# Altium integrated library BYTECH_HW_LIB_2019.IntLib: 907 symbols (part 5 of 6)
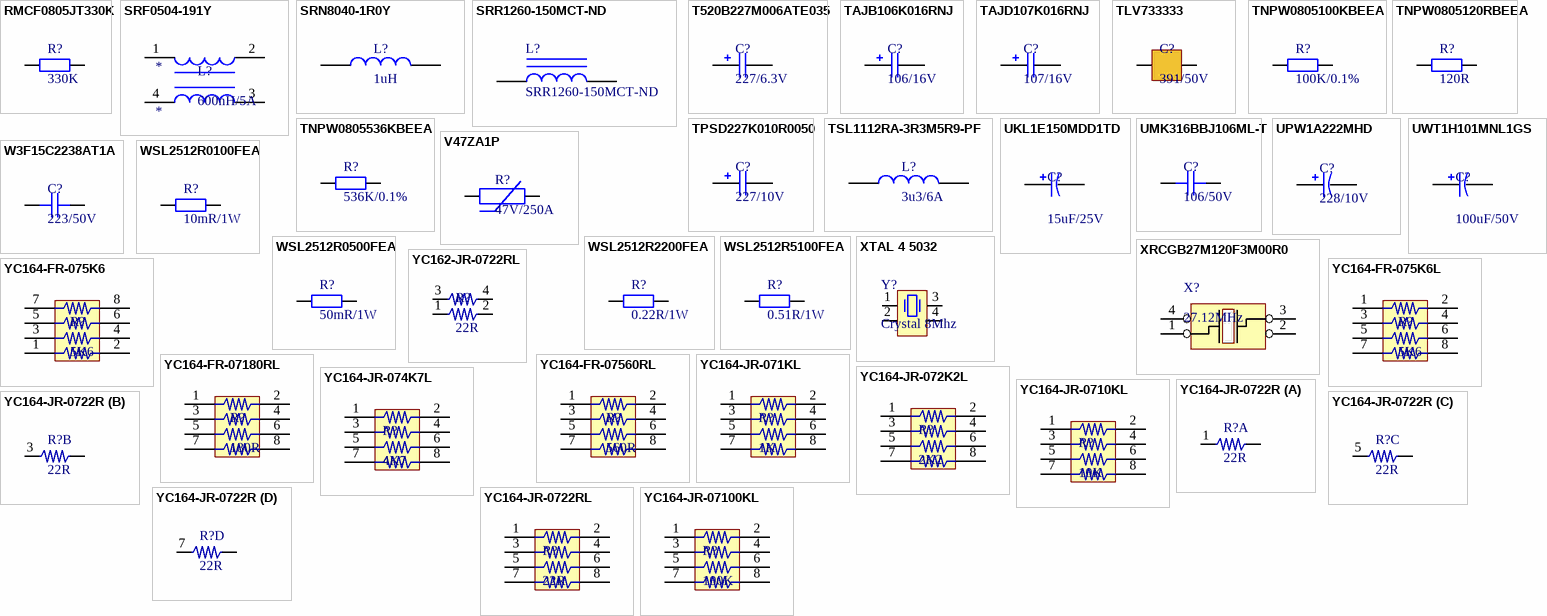
[diagram p43: symbols RMCF0805JT330K to YC164-JR-07100KL]

## UMK316BBJ106ML-T
designator C?, comment 106/50V
CAP CER 10uF 20% 50V X5R 1206; MPN: UMK316BBJ106ML-T; Solder: SMT; CompanyID: VT-01137; Value: 106/50V; Category: CAPACITOR; PinCount: 2
footprint CAPC-1206 (3216) (Resistor, Chip; 3.10 mm L X 1.60 mm W X 0.90 mm H body)
pins: 1, 2

## UPW1A222MHD
designator C?, comment 228/10V
CAP ALUM 2200uF 20% 10V RADIAL; MPN: UPW1A222MHD; CompanyID: VT-00942; Solder: WAVE; Value: 228/10V; Category: CAPACITOR; PinCount: 2
footprint CAP_ALUM_D125_S50_H200
pins: 1, 2

## UWT1H101MNL1GS
designator C?, comment 100uF/50V
CAP ALUM 100UF 20% 50V SMD; MPN: UWT1H101MNL1GS; Solder: SMT; Value: 100uF/50V; Category: CAPACITOR; PinCount: 2
footprint CAP_ALUM_SMT_NICHICON_H8xH10
pins: 1, 2
1 alternate drawing of the same symbol

## V47ZA1P
designator R?, comment 47V/250A
VARISTOR 47V 250A DISC 7MM; MPN: V47ZA1P; Solder: WAVE; CompanyID: VT-00888; Value: 47V/250A; Category: VARISTOR
footprint VARISTOR-V47ZA1P
pins: 1, 2

## W3F15C2238AT1A
designator C?, comment 223/50V
CAP FEEDTHRU 0.022uF 20% 50V 1206; MPN: W3F15C2238AT1A; CompanyID: VT-00531; Solder: SMT; Value: 223/50V; Category: CAPACITOR; PinCount: 2
footprint CAPC-1206 (3216) (Resistor, Chip; 3.10 mm L X 1.60 mm W X 0.90 mm H body)
pins: 1, 2

## WSL2512R0100FEA
designator R?, comment 10mR/1W
RES 0.01 OHM 1% 1W 2512; MPN: WSL2512R0100FEA; MFR: Vishay Dale; Solder: SMT; Value: 10mR/1W; Category: RESISTOR; PinCount: 2
footprint RESC-2512 (6432) (Chip Resistor, Body 6.3x3.2mm, IPC Medium Density)
pins: 1, 2

## WSL2512R0500FEA
designator R?, comment 50mR/1W
RES 0.05 OHM 1% 1W 2512; MPN: WSL2512R0500FEA; MFR: Vishay Dale; Solder: SMT; Value: 50mR/1W; Category: RESISTOR; PinCount: 2
footprint RESC-2512 (6432) (Chip Resistor, Body 6.3x3.2mm, IPC Medium Density)
pins: 1, 2

## WSL2512R2200FEA
designator R?, comment 0.22R/1W
RES 0.22 OHM 1% 1W 2512; MPN: WSL2512R2200FEA; MFR: Vishay Dale; Solder: SMT; Value: 0.22R/1W; Category: RESISTOR; PinCount: 2
footprint RESC-2512 (6432) (Chip Resistor, Body 6.3x3.2mm, IPC Medium Density)
pins: 1, 2

## WSL2512R5100FEA
designator R?, comment 0.51R/1W
RES 0.51 OHM 1% 1W 2512; MPN: WSL2512R5100FEA; MFR: Vishay Dale; Solder: SMT; Value: 0.51R/1W; Category: RESISTOR; PinCount: 2
footprint RESC-2512 (6432) (Chip Resistor, Body 6.3x3.2mm, IPC Medium Density)
pins: 1, 2

## XRCGB27M120F3M00R0
designator X?, comment 27.12MHz
CRYSTAL 27.1200MHZ 6pF SMD; MPN: XRCGB27M120F3M00R0; CompanyID: VT-00760; Solder: SMT; Value: 27.12MHz; Category: CRYSTAL
footprint CRYSTAL-XRCGB27M120F3M10R0 (2x1.6)
pins: 1, 2, 3, 4

## XTAL 4 5032
designator Y?, comment Crystal 8Mhz
CRYSTAL 8.0000MHZ 20PF SMD; MFR: Taisaw; MPN: TZ3063D
footprint Crystal 5032 - 4P (Surface Mount, crystal 4lead, 5.0mm x 3.20mm)
pins: 1 OSC1, 2 GND (power), 3 OSC2, 4 GND (power)

## YC162-JR-0722RL
designator R?, comment 22R
RES ARRAY 2 RES 22 OHM 0606; MPN: YC162-JR-0722RL; CompanyID: VT-01381; Solder: SMT; Value: 22R; Category: RESISTOR; PinCount: 4
footprint CAC-80P160X160-4N (Chip Array, Concave, 4-Leads, Pitch 0.80mm,  Body 1.60x1.60mm,  IPC Medium Density)
pins: 1, 2, 3, 4

## YC164-FR-075K6
designator R?, comment 5K6
RES ARRAY 5K6 (4x0603); MPN: YC164-FR-075K6; CompanyID: VT-00873; Solder: SMT; Value: 5K6; Category: RESISTOR; PinCount: 8
footprint RESC_ARRAY_4x0603 (Resistor, Chip Array, 2 Side Convex, 0.80 mm pitch; 8 pin, 3.20 mm L X 1.60 mm W X 0.60 mm H body)
pins: 1, 2, 3, 4, 5, 6, 7, 8

## YC164-FR-075K6L
designator R?, comment 5K6
RES ARRAY 4 RES 5K6 OHM 1206 (4x0603); MPN: YC164-FR-075K6L; CompanyID: VT-00873; Solder: SMT; Value: 5K6; Category: RESISTOR; PinCount: 8
footprint RESC_ARRAY_4x0603 (Resistor, Chip Array, 2 Side Convex, 0.80 mm pitch; 8 pin, 3.20 mm L X 1.60 mm W X 0.60 mm H body)
pins: 1, 2, 3, 4, 5, 6, 7, 8

## YC164-FR-07180RL
designator R?, comment 180R
RES ARRAY 4 RES 180R OHM 1206 (4x0603); MPN: YC164-FR-07180RL; Solder: SMT; Value: 180R; Category: RESISTOR; PinCount: 8
footprint RESC_ARRAY_4x0603 (Resistor, Chip Array, 2 Side Convex, 0.80 mm pitch; 8 pin, 3.20 mm L X 1.60 mm W X 0.60 mm H body)
pins: 1, 2, 3, 4, 5, 6, 7, 8

## YC164-FR-07560RL
designator R?, comment 560R
RES ARRAY 4 RES 560R OHM 1206 (4x0603); MPN: YC164-FR-07560RL; Solder: SMT; Value: 560R; Category: RESISTOR; PinCount: 8
footprint RESC_ARRAY_4x0603 (Resistor, Chip Array, 2 Side Convex, 0.80 mm pitch; 8 pin, 3.20 mm L X 1.60 mm W X 0.60 mm H body)
pins: 1, 2, 3, 4, 5, 6, 7, 8

## YC164-JR-071KL
designator R?, comment 1K
RES ARRAY 4 RES 1K OHM 1206 (4x0603); MPN: YC164-JR-071KL; Solder: SMT; CompanyID: VT-00784; Value: 1K; Category: RESISTOR; PinCount: 8
footprint RESC_ARRAY_4x0603 (Resistor, Chip Array, 2 Side Convex, 0.80 mm pitch; 8 pin, 3.20 mm L X 1.60 mm W X 0.60 mm H body)
pins: 1, 2, 3, 4, 5, 6, 7, 8

## YC164-JR-072K2L
designator R?, comment 2K2
RES ARRAY 4 RES 2.2K OHM 1206 (4x0603); MPN: YC164-JR-072K2L; CompanyID: VT-00872; Solder: SMT; Value: 2K2; Category: RESISTOR; PinCount: 8
footprint RESC_ARRAY_4x0603 (Resistor, Chip Array, 2 Side Convex, 0.80 mm pitch; 8 pin, 3.20 mm L X 1.60 mm W X 0.60 mm H body)
pins: 1, 2, 3, 4, 5, 6, 7, 8

## YC164-JR-074K7L
designator R?, comment 4K7
RES ARRAY 4 RES 4.7K OHM 1206 (4x0603); MPN: YC164-JR-074K7L; Solder: SMT; CompanyID: VT-0979; Value: 4K7; Category: RESISTOR; PinCount: 8
footprint RESC_ARRAY_4x0603 (Resistor, Chip Array, 2 Side Convex, 0.80 mm pitch; 8 pin, 3.20 mm L X 1.60 mm W X 0.60 mm H body)
pins: 1, 2, 3, 4, 5, 6, 7, 8

## YC164-JR-0710KL
designator R?, comment 10K
RES ARRAY 4 RES 10K OHM 1206 (4x0603); MPN: YC164-JR-0710KL; CompanyID: VT-00783; Solder: SMT; Value: 10K; Category: RESISTOR; PinCount: 8
footprint RESC_ARRAY_4x0603 (Resistor, Chip Array, 2 Side Convex, 0.80 mm pitch; 8 pin, 3.20 mm L X 1.60 mm W X 0.60 mm H body)
pins: 1, 2, 3, 4, 5, 6, 7, 8

## YC164-JR-0722R
designator R?, comment 22R
RES ARRAY 4 RES 22 OHM 1206 (4x0603); MPN: YC164-JR-0722RL; Solder: SMT; CompanyID: VT-00902; Value: 22R; Category: RESISTOR; PinCount: 8
footprint RESC_ARRAY_4x0603 (Resistor, Chip Array, 2 Side Convex, 0.80 mm pitch; 8 pin, 3.20 mm L X 1.60 mm W X 0.60 mm H body)
part A pins: 1, 2
part B pins: 3, 4
part C pins: 5, 6
part D pins: 7, 8

## YC164-JR-0722RL
designator R?, comment 22R
RES ARRAY 4 RES 22 OHM 1206 (4x0603); MPN: YC164-JR-0722RL; CompanyID: VT-00902; Solder: SMT; Value: 22R; Category: RESISTOR; PinCount: 8
footprint RESC_ARRAY_4x0603 (Resistor, Chip Array, 2 Side Convex, 0.80 mm pitch; 8 pin, 3.20 mm L X 1.60 mm W X 0.60 mm H body)
pins: 1, 2, 3, 4, 5, 6, 7, 8

## YC164-JR-07100KL
designator R?, comment 100K
RES ARRAY 4 RES 100K OHM 1206 (4x0603); MPN: YC164-JR-07100KL; Solder: SMT; CompanyID: VT-01239; Value: 100K; Category: RESISTOR; PinCount: 8
footprint RESC_ARRAY_4x0603 (Resistor, Chip Array, 2 Side Convex, 0.80 mm pitch; 8 pin, 3.20 mm L X 1.60 mm W X 0.60 mm H body)
pins: 1, 2, 3, 4, 5, 6, 7, 8

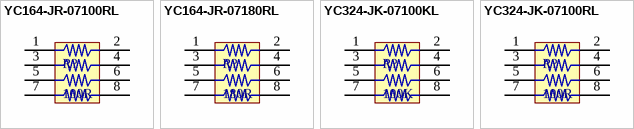
[diagram p27: symbols YC164-JR-07100RL to YC324-JK-07100RL]

## YC164-JR-07100RL
designator R?, comment 100R
RES ARRAY 4 RES 100 OHM 1206 (4x0603); MPN: YC164-JR-07100RL; Solder: SMT; Value: 100R; Category: RESISTOR; PinCount: 8
footprint RESC_ARRAY_4x0603 (Resistor, Chip Array, 2 Side Convex, 0.80 mm pitch; 8 pin, 3.20 mm L X 1.60 mm W X 0.60 mm H body)
pins: 1, 2, 3, 4, 5, 6, 7, 8

## YC164-JR-07180RL
designator R?, comment 180R
RES ARRAY 4 RES 180 OHM 1206 (4x0603); MPN: YC164-JR-07180RL; CompanyID: VT-01022; Solder: SMT; Value: 180R; Category: RESISTOR; PinCount: 8
footprint RESC_ARRAY_4x0603 (Resistor, Chip Array, 2 Side Convex, 0.80 mm pitch; 8 pin, 3.20 mm L X 1.60 mm W X 0.60 mm H body)
pins: 1, 2, 3, 4, 5, 6, 7, 8

## YC324-JK-07100KL
designator R?, comment 100K
RES ARRAY 4 RES 100K OHM 2012 (4x0805); MPN: YC324-JK-07100KL; Solder: SMT; CompanyID: VT-01236; Value: 100K; Category: RESISTOR; PinCount: 8
footprint RESC_ARRAY_4x0805 (Resistor, Chip Array, 2 Side Convex, 1.27 mm pitch; 8 pin, 5.08 mm L X 3.20 mm W X 0.60 mm H body)
pins: 1, 2, 3, 4, 5, 6, 7, 8

## YC324-JK-07100RL
designator R?, comment 100R
RES ARRAY 4 RES 100 OHM 2012 (4x0805); MPN: YC324-JK-07100RL; CompanyID: VT-01111; Solder: SMT; Value: 100R; Category: RESISTOR; PinCount: 8
footprint RESC_ARRAY_4x0805 (Resistor, Chip Array, 2 Side Convex, 1.27 mm pitch; 8 pin, 5.08 mm L X 3.20 mm W X 0.60 mm H body)
pins: 1, 2, 3, 4, 5, 6, 7, 8


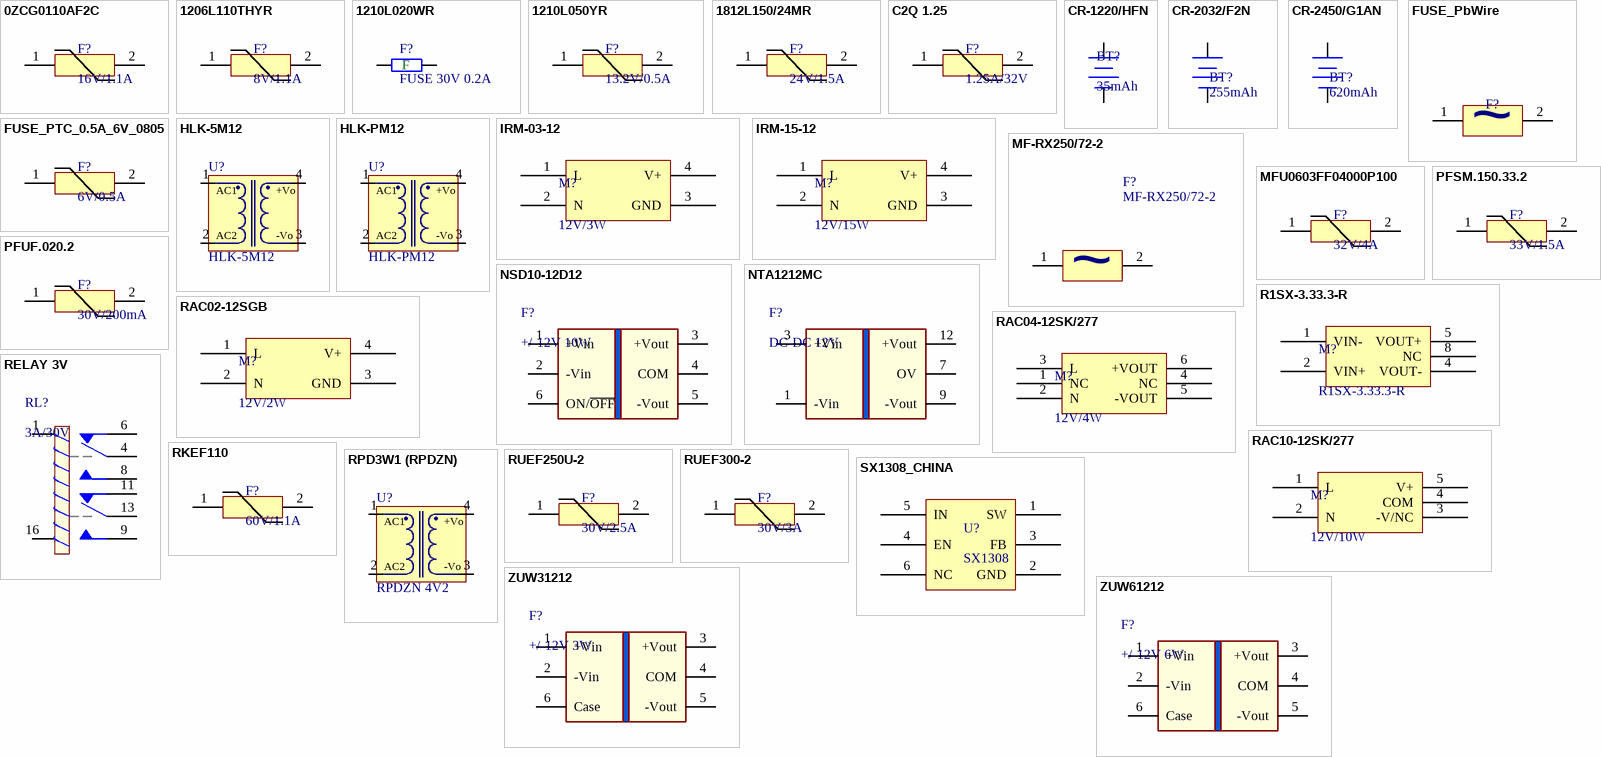
[diagram p28: symbols 0ZCG0110AF2C to ZUW61212]

## 0ZCG0110AF2C
designator F?, comment 16V/1.1A
FUSE-PTC RESTTBLE 1.10A 16V CHIP 1812; MPN: 0ZCG0110AF2C; Solder: SMT; CompanyID: VT-00835; Value: 16V/1.1A
footprint FUSE_1812(4532)
pins: 1, 2

## 1206L110THYR
designator F?, comment 8V/1.1A
FUSE PTC RESET 8V 1.10A 1206; MPN: 1206L110THYR; CompanyID: VT-01102; Solder: SMT; Value: 8V/1.1A
footprint FUSE_1206(3216)
pins: 1, 2

## 1210L020WR
designator F?, comment FUSE 30V 0.2A
PTC RESET 30V 0.2A SMD 1210; MPN: PFUF.020.2; MF-USMF020-2; 1210L020WR; CompanyID: VT-00588; Solder: SMT; Value: FUSE 30V 0.2A
footprint 1210_FUSE
pins: 1, 2
text: F

## 1210L050YR
designator F?, comment 13.2V/0.5A
FUSE PTC RESETTABLE 13.2V 0.5A 1210; MPN: 1210L050YR; Solder: SMT; CompanyID: VT-01118; Value: 13.2V/0.5A
footprint FUSE- 1210 (3225)
pins: 1, 2

## 1812L150/24MR
designator F?, comment 24V/1.5A
FUSE PTC RESETTABLE 24V 1.50A 1812L; MPN: 1812L150/24MR; Solder: SMT; CompanyID: VT-00870; Value: 24V/1.5A
footprint FUSE_1812(4532)
pins: 1, 2

## C2Q 1.25
designator F?, comment 1.25A/32V
FUSE BOARD MNT 1.25A 32VAC 63VDC 0603; MPN: C2Q 1.25; Solder: SMT; CompanyID: VT-01139; Value: 1.25A/32V
footprint FUSE_0603(1608) (Chip Inductor, Body 0.6x0.3mm, IPC High Density)
pins: 1, 2

## CR-1220/HFN
designator BT?, comment 35mAh
BATTERY LITHIUM 3V 35mAh COIN 12.5MM; MPN: CR-1220/HFN; Solder: HAND; CompanyID: VT-01136; Value: 35mAh
footprint BATERRY_CR1220
pins: 1 +, 2 -

## CR-2032/F2N
designator BT?, comment 255mAh
BATTERY LITHIUM 3V 225mAh COIN 20MM; MPN: CR-2032/F2N; Solder: HAND; CompanyID: VT-01026; Value: 255mAh
footprint BATTERY_CR2032 SMD
pins: 1 +, 2 -

## CR-2450/G1AN
designator BT?, comment 620mAh
BATTERY LITHIUM 3V 620mAhCOIN 24.5MM; MPN: CR-2450/G1AN; Solder: HAND; CompanyID: VT-00216; Value: 620mAh
footprint BATERRY_CR2450-3P
pins: 1 +, 2 -

## FUSE_PbWire
designator F?
PB wire fuse; Solder: SMT; CompanyID: VT-xxxx
footprint FUSE_3A_HOLDER
pins: 1, 2
text: ~

## FUSE_PTC_0.5A_6V_0805
designator F?, comment 6V/0.5A
FUSE PTC 0.5A 6V SMD 0805; MPN: FUSE_PTC_0.5A_6V_0805; Solder: SMT; Value: 6V/0.5A
footprint FUSE_0805(2012) (Footprint not found)
pins: 1, 2

## HLK-5M12
designator U?
Ultra-compact module power 12V/5W; MFR: Hi-link; Solder: WAVE; Category: MODULE; MPN: HLK-5M12; PinCount: 4; Value: 12V/5W
footprint HLK-5M12 (Power AC-DC, Body 38x23mm, IPC High Density)
pins: 1 AC, 2, 3, 4
text: AC1; +Vo; AC2; -Vo

## HLK-PM12
designator U?
Ultra-compact module power; MFR: Hi-link; Solder: WAVE; Value: 12V/3W; Category: MODULE; MPN: HLK-PM12; PinCount: 4
footprint HLK-PM12 (Power AC-DC, Body 34x20.2mm, IPC High Density)
pins: 1 AC, 2, 3, 4
text: AC1; +Vo; AC2; -Vo

## IRM-03-12
designator M?, comment 12V/3W
AC/DC CONVERTER 12V 3W; MPN: IRM-03-12; MFR: MEAN WELL; Solder: WAVE; Value: 12V/3W; Category: MODULE; PinCount: 4
footprint IRM-03-12 (Footprint not found)
pins: 1 L, 2 N, 3 GND, 4 V+
1 alternate drawing of the same symbol

## IRM-15-12
designator M?, comment 12V/15W
AC/DC CONVERTER 12V 15W; MPN: IRM-15-12; MFR: MEAN WELL; Solder: WAVE; Value: 12V/15W; Category: MODULE; PinCount: 4
footprint IRM-15-12 (Footprint not found)
pins: 1 L, 2 N, 3 GND, 4 V+
1 alternate drawing of the same symbol

## MF-RX250/72-2
designator F?
FUSE PTC RESETTABLE  2.5A  72V; Solder: SMT; CompanyID: VT-xxxx; MPN: MF-RX250/72-2; Value: MF-RX250/72-2
pins: 1, 2
text: ~

## MFU0603FF04000P100
designator F?, comment 32V/4A
FUSE BOARD MOUNT 4A 32VDC 0603; MPN: MFU0603FF04000P100; Solder: SMT; CompanyID: VT-00111; Value: 32V/4A
footprint FUSE_0603(1608) (Chip Inductor, Body 0.6x0.3mm, IPC High Density)
pins: 1, 2

## NSD10-12D12
designator F?, comment +/-12V 10W
DC DC CONVERTER +/-12V 10W; MPN: NSD10-12D12; Solder: WAVE; Value: +/-12V 10W
footprint MW-NSD10
pins: 1 +Vin, 2 -Vin, 3 +Vout, 4 COM, 5 -Vout, 6 ON/~{OFF}

## NTA1212MC
designator F?, comment DC-DC 12V
DC DC CONVERTER +/-12V 1W; MPN: NTA1212MC; Solder: SMT; Value: DC-DC 12V
footprint NTA1212MC
pins: 1 -Vin, 3 +Vin, 7 OV, 9 -Vout, 12 +Vout

## PFSM.150.33.2
designator F?, comment 33V/1.5A
FUSE PTC 1.5A 33V FST-TRIP SMD; MPN: PFSM.150.33.2; Solder: SMT; CompanyID: VT-01027; Value: 33V/1.5A
footprint FUSE_PFSM.150.33.2
pins: 1, 2

## PFUF.020.2
designator F?, comment 30V/200mA
FUSE PTC 200mA 30V RESET SMD; MPN: PFUF.020.2; CompanyID: VT-00588; Solder: SMT; Value: 30V/200mA
footprint FUSE- 1210 (3225)
pins: 1, 2

## R1SX-3.33.3-R
designator M?
DC DC CONVERTER 3.3V 1W; MFR: Recom Power; Solder: WAVE; MPN: R1SX-3.33.3-R; Value: R1SX-3.33.3-R; Category: MODULE; PinCount: 4
footprint R1SX-XXX (Footprint not found)
pins: 1 VIN-, 2 VIN+, 4 VOUT-, 5 VOUT+, 8 NC
1 alternate drawing of the same symbol

## RAC02-12SGB
designator M?, comment 12V/2W
AC/DC CONVERTER 12V 2W; MPN: RAC02-12SGB; Solder: WAVE; Value: 12V/2W; Category: MODULE; PinCount: 4
footprint RAC02-12SGB (Footprint not found)
pins: 1 L, 2 N, 3 GND, 4 V+
1 alternate drawing of the same symbol

## RAC04-12SK/277
designator M?, comment 12V/4W
AC/DC CONVERTER 12V 4W; MPN: RAC04-12SK/277; Solder: WAVE; Value: 12V/4W; Category: MODULE; PinCount: 6
footprint RAC04-12SK/277 (Footprint not found)
pins: 1 NC, 2 N, 3 L, 4 NC, 5 -VOUT, 6 +VOUT
1 alternate drawing of the same symbol

## RAC10-12SK/277
designator M?, comment 12V/10W
AC/DC CONVERTER 12V 10W; MPN: RAC10-12SK/277; Solder: WAVE; Value: 12V/10W; Category: MODULE; PinCount: 5
footprint RAC10-12SK/277
pins: 1 L, 2 N, 3 -V/NC, 4 COM, 5 V+
1 alternate drawing of the same symbol

## RELAY 3V
designator RL?, comment 3A/30V
RELAY dual switch, coil 3V; MPN: HFD2-003-M-L1; Solder: WAVE; Value: 3A/30V
footprint RELAY 3V
pins: 1 V+, 4 COm1, 6 NC1, 8 NO1, 9 NO2, 11 NC2, 13 COM2, 16 V-

## RKEF110
designator F?, comment 60V/1.1A
PTC RESET FUSE 60V 1.1A RADIAL; MPN: RKEF110; MFR: Littelfuse Inc.; Solder: WAVE; Value: 60V/1.1A
footprint FUSE-RUEF300 (PTC Resettable Fuses - 3A)
pins: 1, 2

## RPD3W1 (RPDZN)
designator U?, comment RPDZN 4V2
Ultra-compact module power; MFR: No Brand; Solder: WAVE; Value: 4V2/700mA; Category: MODULE; MFR_URL: https://item.taobao.com/item.htm?spm=a230r.1.14.1.3e96105f3ARyPk&id=527538079756&ns=1&abbucket=16#detail; MPN: RPDZN 4V2; PinCount: 4
footprint RPD3W1 (RPDZN)
pins: 1 AC, 2, 3, 4
text: AC1; +Vo; AC2; -Vo

## RUEF250U-2
designator F?, comment 30V/2.5A
FUSE POLYSWITCH RUE SERIES 2.5A 30V; MPN: RUEF250U-2; CompanyID: VT-00891; Solder: WAVE; Value: 30V/2.5A
footprint FUSE-RUEF250U-2 (PTC Resettable Fuses - 2A)
pins: 1, 2

## RUEF300-2
designator F?, comment 30V/3A
PTC RESET FUSE 30V 3A RADIAL; MPN: RUEF300-2; MFR: Littelfuse Inc.; Solder: WAVE; CompanyID: VT-00887; Value: 30V/3A
footprint FUSE-RUEF300 (PTC Resettable Fuses - 3A)
pins: 1, 2

## SX1308_CHINA
designator U?, comment SX1308
footprint SOT23-6
pins: 1 SW (power), 2 GND (power), 3 FB (power), 4 EN (power), 5 IN (power), 6 NC (power)

## ZUW31212
designator F?, comment +/-12V 3W
DC DC CONVERTER +/-12V 3W; MPN: ZUW31212; Solder: WAVE; Value: +/-12V 3W
footprint COSEL_ZUW31212
pins: 1 +Vin, 2 -Vin, 3 +Vout, 4 COM, 5 -Vout, 6 Case

## ZUW61212
designator F?, comment +/-12V 6W
DC DC CONVERTER +/-12V 6W; MPN: ZUW61212; Solder: WAVE; Value: +/-12V 6W
footprint COSEL_ZUW61212
pins: 1 +Vin, 2 -Vin, 3 +Vout, 4 COM, 5 -Vout, 6 Case


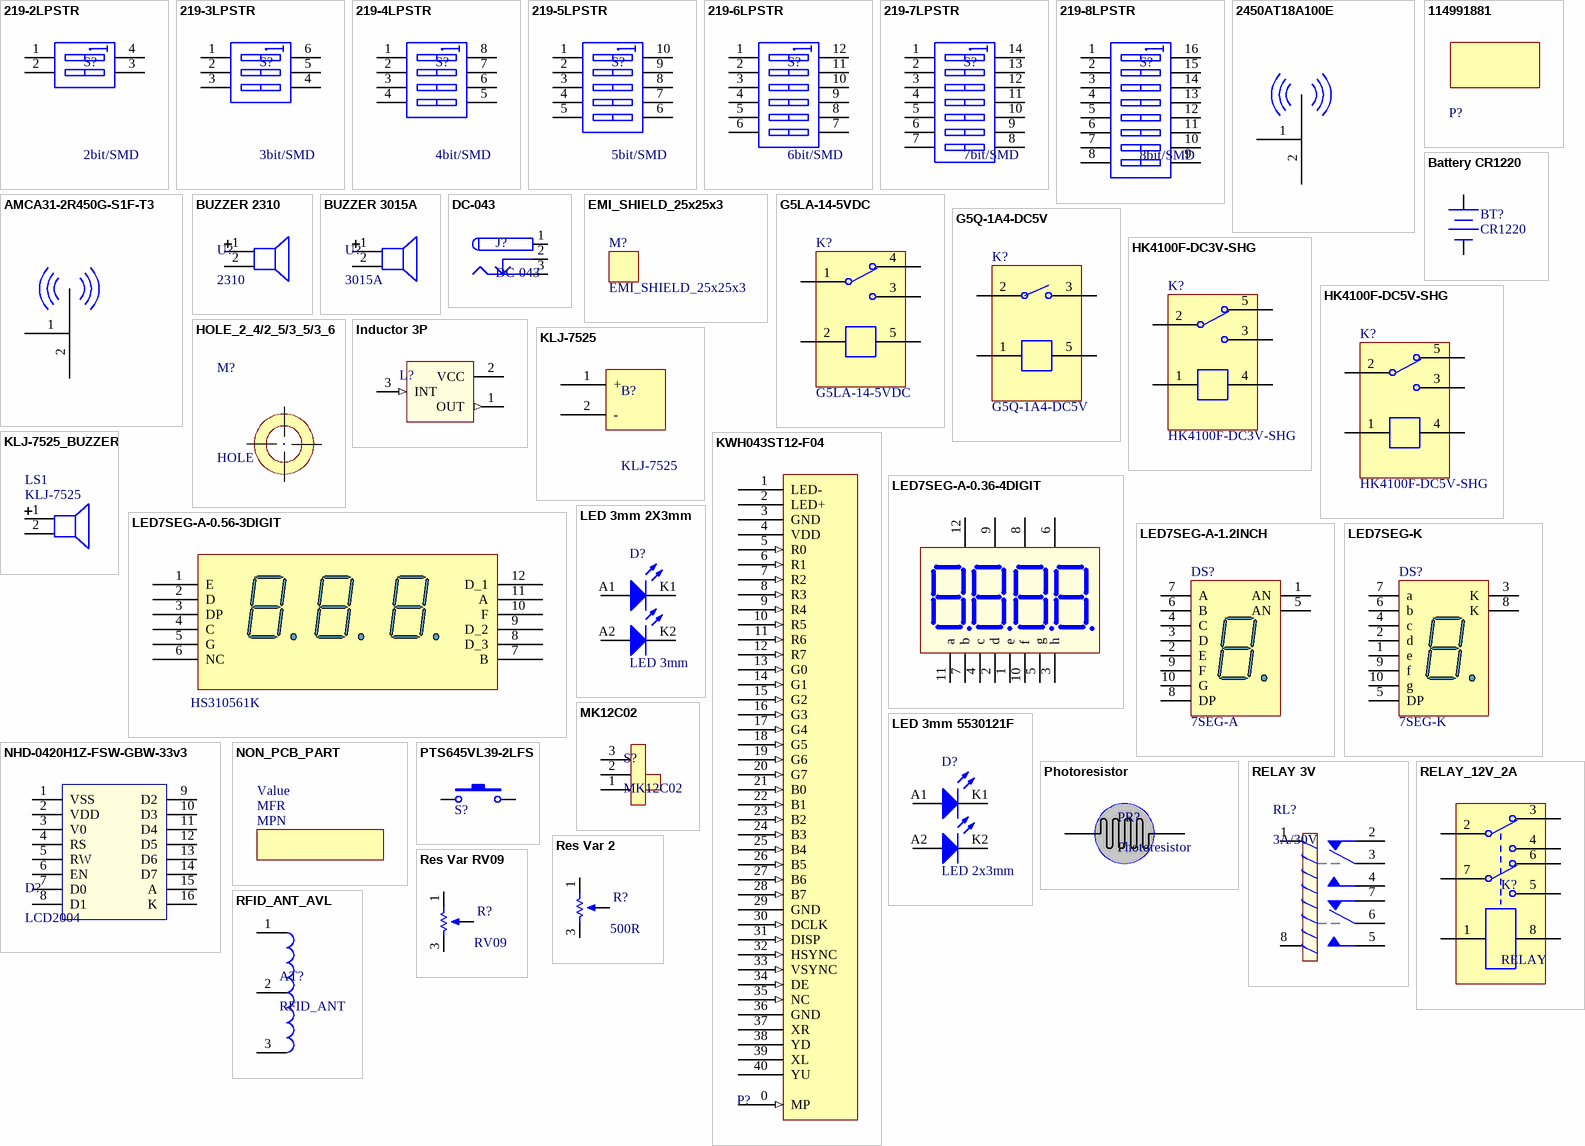
[diagram p29: symbols 219-2LPSTR to RFID_ANT_AVL]

## 219-2LPSTR
designator S?, comment 2bit/SMD
SWITCH SLIDE DIP SPST 100MA 20V; MPN: 219-2LPSTR; CompanyID: VT-xxxx; Solder: SMT; Value: 2bit/SMD
footprint 219-2LPSTR (Footprint not found)
pins: 1 A1, 2 A2, 3 B2, 4 B1

## 219-3LPSTR
designator S?, comment 3bit/SMD
SWITCH SLIDE DIP SPST 100MA 20V; MPN: 219-3LPSTR; CompanyID: VT-xxxx; Solder: SMT; Value: 3bit/SMD
footprint 219-3LPSTR (Footprint not found)
pins: 1 A1, 2 A2, 3 A3, 4 A4, 5 B4, 6 B3

## 219-4LPSTR
designator S?, comment 4bit/SMD
SWITCH SLIDE DIP SPST 100MA 20V; MPN: 219-4LPSTR; CompanyID: VT-xxxx; Solder: SMT; Value: 4bit/SMD
footprint 219-4LPSTR (Footprint not found)
pins: 1 A1, 2 A2, 3 A3, 4 A4, 5 B4, 6 B3, 7 B2, 8 B1

## 219-5LPSTR
designator S?, comment 5bit/SMD
SWITCH SLIDE DIP SPST 100MA 20V; MPN: 219-5LPSTR; CompanyID: VT-xxxx; Solder: SMT; Value: 5bit/SMD
footprint 219-5LPSTR (Footprint not found)
pins: 1 A1, 2 A2, 3 A3, 4 A4, 5 B4, 6 B3, 7 B2, 8 B1, 9 B2, 10 B3

## 219-6LPSTR
designator S?, comment 6bit/SMD
SWITCH SLIDE DIP SPST 100MA 20V; MPN: 219-6LPSTR; CompanyID: VT-xxxx; Solder: SMT; Value: 6bit/SMD
footprint 219-6LPSTR (Footprint not found)
pins: 1 A1, 2 A2, 3 A3, 4 A4, 5 A5, 6 A6, 7 B2, 8 B1, 9 B2, 10 B3, 11 B4, 12 B5

## 219-7LPSTR
designator S?, comment 7bit/SMD
SWITCH SLIDE DIP SPST 100MA 20V; MPN: 219-7LPSTR; CompanyID: VT-xxxx; Solder: SMT; Value: 7bit/SMD
footprint 219-7LPSTR (SWITCH SLIDE DIP SPST 100MA 20V)
pins: 1 A1, 2 A2, 3 A3, 4 A4, 5 A5, 6 A6, 7 B2, 8 B1, 9 B2, 10 B3, 11 B4, 12 B5, 13 B6, 14 B7

## 219-8LPSTR
designator S?, comment 8bit/SMD
SWITCH SLIDE DIP SPST 100MA 20V; MPN: 219-8LPSTR; CompanyID: VT-xxxx; Solder: SMT; Value: 8bit/SMD
footprint 219-8LPSTR (SWITCH SLIDE DIP SPST 100MA 20V)
pins: 1 A1, 2 A2, 3 A3, 4 A4, 5 A5, 6 A6, 7 B2, 8 B3, 9 B2, 10 B3, 11 B4, 12 B5, 13 B6, 14 B7, 15 B8, 16 B9

## 2450AT18A100E
designator AT?, comment 2.4GHz  (value not drawn)
RF ANT 2.4GHZ CHIP SOLDER SMD; MPN: 2450AT18A100E; MFR: Johanson Technology Inc.; Solder: SMT; Value: 2.4GHz
footprint 2450AT18A100E (Footprint not found)
pins: 1 AT, 2 0

## 114991881
designator P?  (value not drawn)
OV2640 FISHEYE CAMERA; MFR: Seeed Technology Co., Ltd; Value: 114991881; MPN: 114991881; MFR_URL: *
footprint SEEED_OV2640_CAM (Footprint not found)

## AMCA31-2R450G-S1F-T3
designator AT?, comment 2.4GHz  (value not drawn)
RF ANT 2.4GHZ CHIP SOLDER SMD; MPN: AMCA31-2R450G-S1F-T3; Solder: SMT; Value: 2.4GHz
footprint AMCA31-2R450G-S1F-T3 (Footprint not found)
pins: 1 AT, 2 0

## Battery CR1220
designator BT?, comment CR1220
Multicell Battery
footprint PIN3V-CR1220
pins: 1 +, 2 -

## BUZZER 2310
designator U?, comment 2310
Loa gốm 23mm - pitch 10mm
footprint BUZZ_23mm
pins: 1, 2

## BUZZER 3015A
designator U?, comment 3015A
footprint BUZZER 3015A
pins: 1, 2

## DC-043
designator J?
DC Plug 4.5mm/1.65mm
footprint DC43 (DC plug 4.5mm/1.65mm)
pins: 1 (power), 2 (power), 3 (power)

## EMI_SHIELD_25x25x3
designator M?
Sold By: SMT; MPN: EMI_SHIELD_25x25x3; Value: EMI_SHIELD_25x25x3
footprint EMI_SHIELD_25x25x3 (Footprint not found)

## G5LA-14-5VDC
designator K?
5V, 5pin, 10A; Solder: HAND; MPN: G5LA-14-5VDC; CompanyID: *; Value: G5LA-14-5VDC
footprint G5LA-14 (Footprint not found)
pins: 1, 2, 3, 4, 5

## G5Q-1A4-DC5V
designator K?
5V, 5pin, 10A; MPN: G5LA-14-5VDC; Solder: HAND; Value: G5LA-14-5VDC; CompanyID: *
footprint G5Q-1A4-DC5
pins: 1 2, 2, 3, 5

## HK4100F-DC3V-SHG
designator K?
3V, 6pin, 3A; Solder: HAND; MPN: HK4100F-DC3V-SHG; CompanyID: *; Value: HK4100F-DC3V
footprint HK4100F (Footprint not found)
pins: 1, 2, 3, 4, 5

## HK4100F-DC5V-SHG
designator K?
5V, 6pin, 3A; Solder: HAND; MPN: HK4100F-DC5V-SHG; CompanyID: *; Value: HK4100F-DC5V
footprint HK4100F (Footprint not found)
pins: 1, 2, 3, 4, 5

## HOLE_2_4/2_5/3_5/3_6
designator M?, comment HOLE  (no BOM)
HOLE 2_4/2_5/3_5/3_6; MPN: None; Solder: Not Fill; CompanyID: VT-; ClassName: MECH_HOLE; Value: HOLE
footprint HOLE_3MM_5MM
footprint HOLE_2MM_4MM
footprint HOLE_2MM_5MM
footprint HOLE_3MM_6MM

## Inductor 3P
designator L?
footprint Inductor 3P (Tu hoa < 22uF/16>50V)
pins: 1 OUT (out), 2 VCC (power), 3 INT (in)

## KLJ-7525
designator B?
SMD Magnetic Buzzer; MPN: KLJ-7525 (Link taobao:  https://item.taobao.com/item.htm?spm=a230r.1.14.32.4lkJb8&id=10677723267&ns=1&abbucket=1#detail); CompanyID: VT-01016; Solder: SMT; Value: KLJ-7525
footprint KLJ-7525
pins: 1 +, 2 -

## KLJ-7525_BUZZER
designator LS1, comment KLJ-7525
Dimension 75x75x25 mm
footprint KLJ-7525
pins: 1, 2

## KWH043ST12-F04
designator P?  (value not drawn)
4.3 inch TFT LCD, 480x272 pixel; MFR: FORMIKE; Solder: SMT; Value: KWH043ST12-F04; MPN: KWH043ST12-F04; MFR_URL: *; PinCount: 42
footprint MOLX-54104-4031 (FPC Connector, 40-Leads, Right Angle, Pitch 0.5 mm, Mated Height 2.0 mm, SMT)
footprint KWH043ST12-F04 (Footprint not found)
pins: 0 MP (in), 1 LED- (power), 2 LED+ (power), 3 GND (power), 4 VDD (power), 5 R0 (in), 6 R1 (in), 7 R2 (in), 8 R3 (in), 9 R4 (in), 10 R5 (in), 11 R6 (in), 12 R7 (in), 13 G0 (in), 14 G1 (in), 15 G2 (in), 16 G3 (in), 17 G4 (in), 18 G5 (in), 19 G6 (in), 20 G7 (in), 21 B0 (in), 22 B1 (in), 23 B2 (in), 24 B3 (in), 25 B4 (in), 26 B5 (in), 27 B6 (in), 28 B7 (in), 29 GND (power), 30 DCLK (in), 31 DISP (in), 32 HSYNC (in), 33 VSYNC (in), 34 DE (in), 35 NC (in), 36 GND (power), 37 XR, 38 YD, 39 XL, 40 YU

## LED7SEG-A-0.36-4DIGIT
designator D?
4 digit 7 segment anot; Solder: WAVE; Category: LED
footprint LED7SEG-4-0.36
pins: 1 e, 2 d, 3 h, 4 c, 5 g, 6 V4, 7 b, 8 V3, 9 V2, 10 f, 11 a, 12 V1

## LED7SEG-A-0.56-3DIGIT
designator D?, comment HS310561K
3 digit 7 segment anot, 37.6 x 19 x 8, RED; Solder: WAVE; Category: LED; MPN: HS310561K; Value: HS310561K
footprint LED_7SEG_3_DIGIT_0.56_INCH (Footprint not found)
pins: 1 E "Cathode", 2 D "Cathode", 3 DP, 4 C, 5 G, 6 NC, 7 B, 8 D_3, 9 D_2, 10 F, 11 A, 12 D_1

## LED7SEG-A-1.2INCH
designator DS?, comment 7SEG-A
1.2 inch, 40.8x28.8x9mm Anot
footprint LED_7SEG_1_DIGIT_1.20_INCH
pins: 1 AN "Common Anode", 2 E "Cathode", 3 D "Cathode", 4 C "Cathode", 5 AN "Common Anode", 6 B "Cathode", 7 A "Cathode", 8 DP "Cathode", 9 F "Cathode", 10 G "Cathode"

## LED7SEG-K
designator DS?, comment 7SEG-K
14.2 mm General Purpose Blue 7-Segment Display: CC, RH DP, Gray Surface
footprint LED_7SEG_1DIGIT (LED7SEG)
pins: 1 e "Anode", 2 d "Anode", 3 K "Common Cathode", 4 c "Anode", 5 DP "Anode", 6 b "Anode", 7 a "Anode", 8 K "Common Cathode", 9 f "Anode", 10 g "Anode"

## LED 3mm 2X3mm
designator D?, comment LED 3mm
LED 3mm, Bi-Level LED Indicator LED; Part Number: LED 3mm + LED holder 2; Brand: China; Name VNET: VT_LED_3mm_2x3
footprint LED-2x3mm (LED; 2x3mm, Bi-Level LED Indicator LED)
pins: A1, A2, K1, K2

## LED 3mm 5530121F
designator D?, comment LED 2x3mm
LED 2HI 3MM GREEN OVER RED PCMNT; MFR: Dialight; MPN: 5530121F
footprint LED-2x3mm - 5530121F (LED; 2x3mm, Bi-Level LED Indicator LED)
pins: A1, A2, K1, K2

## MK12C02
designator S?
footprint MK12C02
pins: 1 + (power), 2 + (power), 3 + (power)

## NHD-0420H1Z-FSW-GBW-33v3
designator D?, comment LCD2004
footprint NHD-0420H1Z-FSW-GBW-33v3
pins: 1 VSS, 2 VDD, 3 V0, 4 RS, 5 RW, 6 EN, 7 D0, 8 D1, 9 D2, 10 D3, 11 D4, 12 D5, 13 D6, 14 D7, 15 A, 16 K

## NON_PCB_PART
designator M?, comment Value
Solder: *; Category: Misc; Value: Value; MPN: MPN; MFR: MFR

## Photoresistor
designator PR?
footprint Photoresistor
pins: 1, 2

## PTS645VL39-2LFS
designator S?, comment SW  (value not drawn)
Switch; Value: BUTTON2; Solder: HAND
footprint PTS645VL39-2LFS (Length 7mm)
pins: 1, 2

## RELAY 3V
designator RL?, comment 3A/30V
RELAY dual switch, coil 3V; MPN: HFD4V/-03-L-NiL-NiL; Solder: WAVE; Value: 3A/30V
footprint RELAY 3V-1A
pins: 1 V+, 2 NC1, 3 COm1, 4 NO1, 5 NO2, 6 COM2, 7 NC2, 8 V-

## RELAY_12V_2A
designator K?, comment RELAY
Relay 8pin, 12V, 2A contact; CompanyID: VT-00250; Solder: HAND; Value: RELAY
footprint RY12W-K (Takamisawa Relay)
pins: 1, 2, 3, 4, 5, 6, 7, 8

## Res Var 2
designator R?, comment 500R
Variable Resistor
footprint RES_VAR_Type2
pins: 1, 2, 3
1 alternate drawing of the same symbol

## Res Var RV09
designator R?, comment RV09
Variable Resistor 10K; Value: 10K
footprint RES RV09
pins: 1, 2, 3
1 alternate drawing of the same symbol

## RFID_ANT_AVL
designator AT?, comment RFID_ANT  (net tie, no BOM)
footprint RFID_ANT_AVL (Footprint not found)
pins: 1, 2, 3

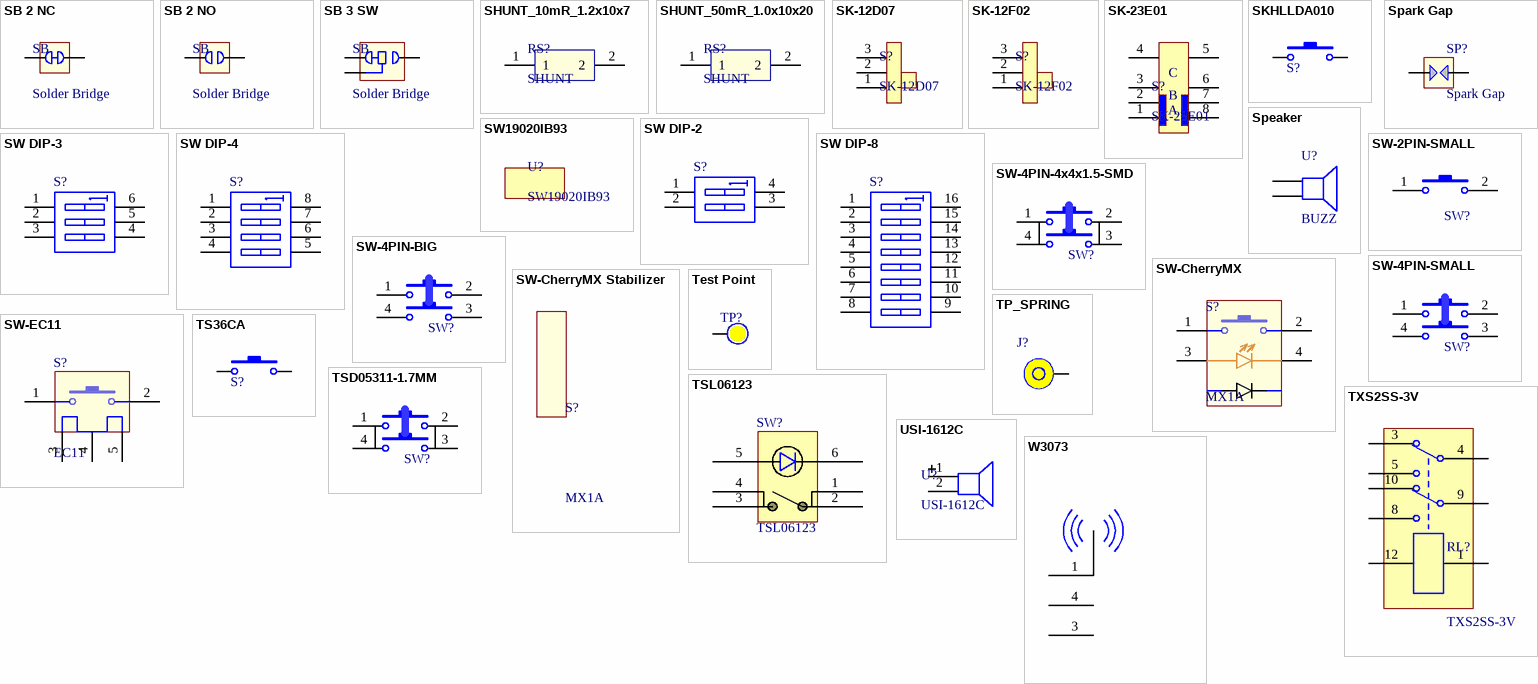
[diagram p30: symbols SB 2 NC to W3073]

## SB 2 NC
designator SB, comment Solder Bridge  (no BOM)
Solder Bridge 2; Solder: Not Fill; Value: Solder Bridge
footprint SB2_NC (Footprint not found)
pins: 1, 2

## SB 2 NO
designator SB, comment Solder Bridge  (no BOM)
Solder Bridge 2; Solder: Not Fill; Value: Solder Bridge
footprint SB2_NO (Footprint not found)
pins: 1, 2

## SB 3 SW
designator SB, comment Solder Bridge  (no BOM)
Solder Bridge 3; Solder: Not Fill; Value: Solder Bridge
footprint SB3_SW (Footprint not found)
pins: 1, 2, 3

## SHUNT_10mR_1.2x10x7
designator RS?, comment SHUNT
Shunt 10mR 1.2x10x7MM; Solder: HAND; MPN: Shunt 10mR 1.2x10x7MM; CompanyID: *; Value: 10mR
footprint Shunt 10mR 1.2x10x7MM (Footprint not found)
pins: 1, 2

## SHUNT_50mR_1.0x10x20
designator RS?, comment SHUNT
SHUNT_50mR_1.0x10x20; MPN: Shunt 10mR 1.2x10x7MM; Solder: HAND; Value: 10mR; CompanyID: *
footprint Shunt 50mR 1.0x10x20MM
pins: 1, 2

## SK-12D07
designator S?
footprint SK-12D07
pins: 1 + (power), 2 + (power), 3 + (power)

## SK-12F02
designator S?
footprint SK-12F02 (Footprint not found)
pins: 1 + (power), 2 + (power), 3 + (power)

## SK-23E01
designator S?
footprint SK-23E01 (Footprint not found)
pins: 1 + (power), 2 + (power), 3 + (power), 4 + (power), 5 + (power), 6 + (power), 7 + (power), 8 + (power)
text: C; B; A

## SKHLLDA010
designator S?, comment SW  (value not drawn)
Switch 3*6*5 vertical; Value: BUTTON2; Solder: HAND
footprint SKHLLDA010 (Length 7mm)
pins: 1, 2

## Spark Gap
designator SP?  (no BOM)
Solder: Not Fill; Value: Spark Gap
footprint SPARK GAP
footprint SPARK GAP
pins: 1, 2

## Speaker
designator U?, comment BUZZ
Loudspeaker
footprint BUZZER_D9_TH
footprint BUZZER_through_hole
pins: 1, 2

## SW19020IB93
designator U?
SW19020IB93 GPS/GNSS Active Antenna U.FL; MFR: Sunny Way; Solder: MAN; MPN: SW19020IB93; Value: *; Category: ANTENNA
footprint SW19020IB93 (Footprint not found)

## SW DIP-2
designator S?
DIP Switch, 2 Position, SPST
footprint DIPSWITCH2
pins: 1 A1, 2 A2, 3 B2, 4 B1

## SW DIP-3
designator S?
DIP Switch, 3 Position, SPST
footprint DIPSWITCH3
pins: 1 A1, 2 A2, 3 A3, 4 B3, 5 B2, 6 B1

## SW DIP-4
designator S?
DIP Switch, 4 Position, SPST
footprint DIPSWITCH4
pins: 1 A1, 2 A2, 3 A3, 4 A4, 5 B4, 6 B3, 7 B2, 8 B1

## SW DIP-8
designator S?
DIP Switch, 8 Position, SPST
footprint DIPSWITCH8
pins: 1 A1, 2 A2, 3 A3, 4 A4, 5 A5, 6 A6, 7 A7, 8 A8, 9 B8, 10 B7, 11 B6, 12 B5, 13 B4, 14 B3, 15 B2, 16 B1

## SW-2PIN-SMALL
designator SW?, comment SW-2P-S  (value not drawn)
Switch Small 2 Pin
footprint SW-2P-S
pins: 1, 2

## SW-4PIN-4x4x1.5-SMD
designator SW?, comment SW-4P-S  (value not drawn)
Switch Small 4 Pin
footprint SW-4PIN-4x4x1.5-SMD
pins: 1, 2, 3, 4

## SW-4PIN-BIG
designator SW?, comment SW-4P-B  (value not drawn)
Switch Big 4 Pin
footprint SW-4P-B (Nut bam lon)
pins: 1, 2, 3, 4

## SW-4PIN-SMALL
designator SW?, comment SW-4P-S  (value not drawn)
Switch Small 4 Pin
footprint SW-4P-S
pins: 1, 2, 3, 4

## SW-CherryMX
designator S?, comment MX1A
Switch
footprint SW - CherryMX
pins: 1, 2, 3, 4

## SW-CherryMX Stabilizer
designator S?, comment MX1A
Switch
footprint SW - CherryMX - Stabilizer

## SW-EC11
designator S?, comment EC11
Switch
footprint SW-EC11 (Cong tac vo cap EC11)
pins: 1 D, 2 E, 3 A, 4 C, 5 B

## Test Point
designator TP?  (no BOM)
Test Point; Solder: NF
footprint Test Point 1 Side
footprint Test Point 2 Side
footprint Test Point 1 MM
footprint Test Point 2 Side - 2MM (Test Point 2 Side)
pins: 0

## TP_SPRING
designator J?, comment Connector Spring  (value not drawn)
Connector SPRING Height 12mm; MPN: MP512-11 44; MFR: China; URL: *
footprint SPRING (Connector Spring)
pins: 1 (power)

## TS36CA
designator S?, comment SW  (value not drawn)
Switch; Value: BUTTON2; Solder: HAND
footprint TS36CA (Length 7mm)
pins: 1, 2

## TSD05311-1.7MM
designator SW?  (value not drawn)
Switch Small 4 Pin SMD, Height 1.7mm; Solder: SMT; CompanyID: VT-xxxx; Value: TSD05311-1.7MM; MPN: TSD05311-1.7MM; MFR: *; MFR_URL: *; PinCount: 4
footprint SW-4PIN-4x4x1.5-SMD
pins: 1, 2, 3, 4

## TSL06123
designator SW?
Illuminated tact switch with colorful LED; CompanyID: VT-01384; Solder: WAVE; MPN: TSL06123; Value: TSL06123
footprint TSL06123
pins: 1, 2, 3, 4, 5, 6

## TXS2SS-3V
designator RL?
RELAY GEN PURPOSE DPDT 1A 3VDC; MFR: Panasonic; MPN: TXS2SS-3V
footprint TXS2SS-3V (Footprint not found)
pins: 1, 3, 4, 5, 8, 9, 10, 12

## USI-1612C
designator U?
footprint USI-1612C
pins: 1, 2

## W3073
designator AT?  (value not drawn)
Ceramic Quad Band Monopole Antenna; MFR: PulseLarsen Antennas; Solder: SMT; MPN: W3073; Value: W3073
footprint W3073_VER1
footprint W3073_VER2 (Footprint not found)
footprint W3073_VER3 (Footprint not found)
pins: 1, 3 1, 4 AT

